# Altium footprint library PcbLib_jp.PcbLib: 178 footprints (part 7 of 12)
Each footprint in its own frame and in the unit in brackets; x right, y up, seen from the top. Pads: shape width x height; smd on the part's side, far side on the other; paste and mask are expansions set on the pad; w line width, h text height; cw(c..) or ccw(c..) is an arc to the next point about the centre after c.
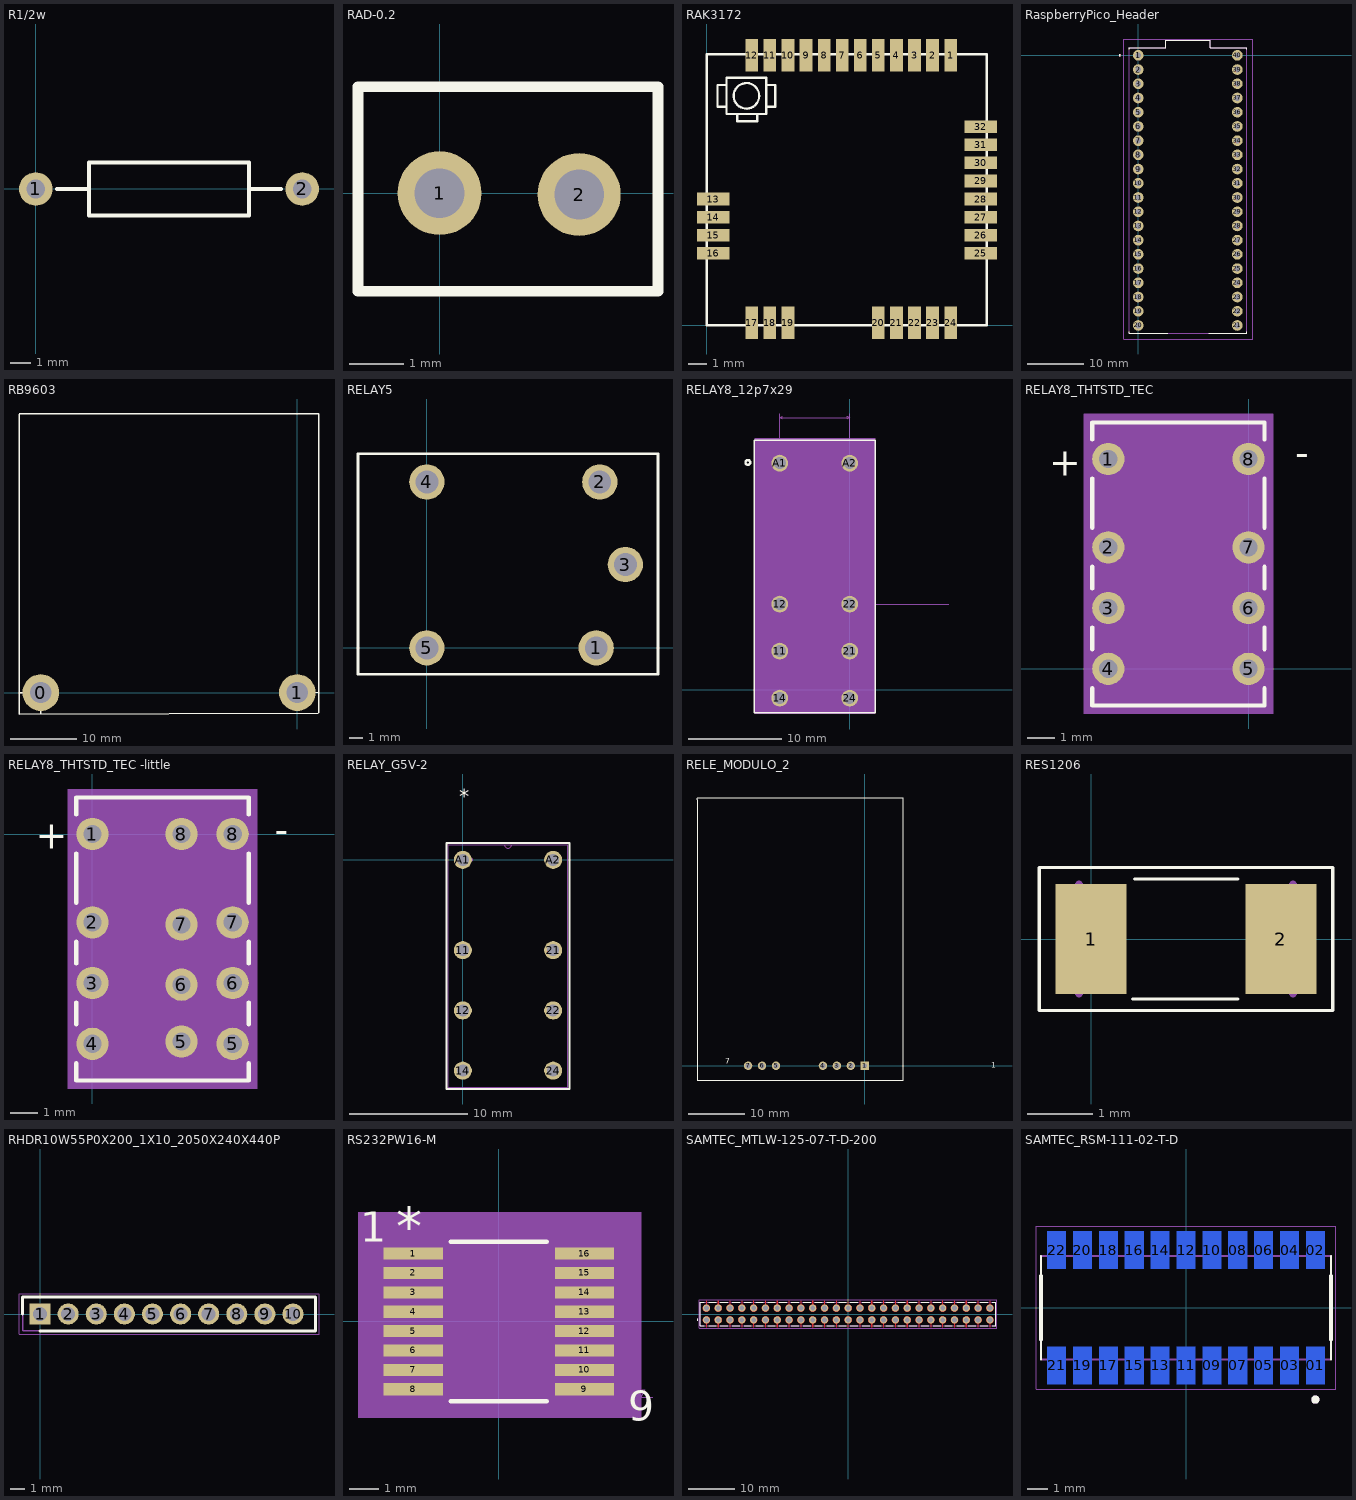
[diagram p6: the footprints below, top view; thin cyan lines are the x and y axes]

## R1/2w [mm] "Axial Device, Thru-Hole; 2 Leads; 0.5 in Pin Spacing"
height 2.54
pads (2):
  round 1.6 hole 0.9: 1(0,0) 2(12.7,0)
Top Overlay:
  lines w0.2: 1.016,0 2.54,0 ; 10.16,0 11.684,0 ; 2.54,-1.27 2.54,1.27 10.16,1.27 10.16,-1.27 2.54,-1.27
3D body "70398111.stp": height 2.1, standoff -0.1, extent 3.526,-1.108 9.326,1.092

## RAD-0.2 [mil] "Radial Cap, Thru-Hole; 2 Leads; 0.2 in Pin Spacing"
pads (2):
  round 60.63 hole 35.98: 1(0,0)
  round 60 hole 35.98: 2(101,-1)
Top Overlay:
  lines w7.87: 158,76 158,-71 -59,-71 -59,77 158,77
3D body "User Library-Jumper SL2.STEP": height 452.76, standoff -23.62, extent -53.42,-51 143.43,49

## RAK3172 [mm]
pads (32):
  rect 0.7x1.8 smd: 1(13.5,14.945) 2(12.5,14.945) 3(11.5,14.945) 4(10.5,14.945) 5(9.5,14.945) 6(8.5,14.945) 7(7.5,14.945) 8(6.5,14.945) 9(5.5,14.945) 10(4.5,14.945) 11(3.5,14.945) 12(2.5,14.945) 17(2.5,0.145) 18(3.5,0.145) 19(4.5,0.145) 20(9.5,0.145) 21(10.5,0.145) 22(11.5,0.145) 23(12.5,0.145) 24(13.5,0.145)
  rect 1.8x0.7 smd: 13(0.365,6.99) 14(0.365,5.99) 15(0.365,4.99) 16(0.365,3.99) 25(15.165,3.99) 26(15.165,4.99) 27(15.165,5.99) 28(15.165,6.99) 29(15.165,7.99) 30(15.165,8.99) 31(15.165,9.99) 32(15.165,10.99)
Top Overlay:
  circle w0.127: c2.2,12.7 r0.707
  lines w0.127: 1.1,12.1 1.1,11.7 1.7,11.7 ; 1.1,12.1 1.1,13.3 ; 1.1,12.1 0.6,12.1 0.6,13.3 1.1,13.3 ; 1.1,13.3 1.1,13.7 3.3,13.7 3.3,13.3 ; 1.7,11.7 1.7,11.3 2.8,11.3 2.8,11.7 ; 1.7,11.7 2.8,11.7 ; 2.8,11.7 3.3,11.7 3.3,12.1 ; 3.3,12.1 3.8,12.1 3.8,13.3 3.3,13.3 ; 3.3,12.1 3.3,13.3 ; 0,0 0,15 15.5,15 15.5,0 0,0
3D body "step_temp.STEP": height 4.5, standoff 0.99, extent 0.08,0.07 15.58,15.07

## RaspberryPico_Header [mil]
pads (40):
  round 75 hole 40: 1(0,0) 2(0,-100) 3(0,-200) 4(0,-300) 5(0,-400) 6(0,-500) 7(0,-600) 8(0,-700) 9(0,-800) 10(0,-900) 11(0,-1000) 12(0,-1100) 13(0,-1200) 14(0,-1300) 15(0,-1400) 16(0,-1500) 17(0,-1600) 18(0,-1700) 19(0,-1800) 20(0,-1900) 21(697.72,-1900) 22(697.72,-1800) 23(697.72,-1700) 24(697.72,-1600) 25(697.72,-1500) 26(697.72,-1400) 27(697.72,-1300) 28(697.72,-1200) 29(697.72,-1100) 30(697.72,-1000) 31(697.72,-900) 32(697.72,-800) 33(697.72,-700) 34(697.72,-600) 35(697.72,-500) 36(697.72,-400) 37(697.72,-300) 38(697.72,-200) 39(697.72,-100) 40(697.72,0)
Top Layer:
  circle w7.87: c-129,0 r3.94
Top Overlay:
  circle w7.87: c-128.92,0 r3.94
  lines w5: -62.39,-1944.09 -62.39,-1953.94 206.91,-1953.94 ; -62.39,44.09 -62.39,53.94 193.52,53.94 193.52,105.12 508.48,105.12 508.48,53.94 764.39,53.94 764.39,44.09 ; 495.09,-1953.94 764.39,-1953.94 764.39,-1944.09
Mechanical 13:
  circle w7.87: c-128.92,0 r3.94
  lines w5: -62.39,-1953.94 -62.39,53.94 193.52,53.94 193.52,105.12 508.48,105.12 508.48,53.94 764.39,53.94 764.39,-1953.94 -62.39,-1953.94
Mechanical 15:
  lines w1.97: -103.33,-1995.28 805.33,-1995.28 805.33,114.96 -103.33,114.96 -103.33,-1995.28
3D body: height 110.24, standoff 0, extent 277.72,-805 277.72,-805
3D body "PICO_PinsDown.STEP": height 442.13, standoff -59.06, extent -64.05,-1954.53 762.72,104.53

## RB9603 [mil] "Modulo Satelital"
pads (2):
  round 217.48 hole 125.98: 0(-1520,2) 1(-1,2)
Top Overlay:
  lines w7.99: -1648,-125 -1648,1649.65 ; -1648,1652 126.02,1652 126.02,-119 ; -1645,-125 123.65,-122 ; -1645.02,1 -1523,1 ; -1522,-124.02 -1522,1 ; -0.02,0 124,3
3D body "RockBLOCK_9603 v2.step": height 585.72, standoff -83.43, extent -1656.15,-117.84 117.47,2041.6

## RELAY5 [mil]
pads (5):
  round 100 / inner round 60 / far side round 100 hole 65: 1(480,0) 2(490,470) 3(562.47,236) 4(0,470) 5(0,0)
Top Overlay:
  lines w8: -195,-75 -195,550 655,550 655,-75 -195,-75
3D body "20648.stp": height 622.05, standoff -129.92, extent -158.76,-70.02 620.76,552.02

## RELAY8_12p7x29 [mil]
pads (8):
  round 71 hole 51 mask+0: 11(-295.28,163.26) 12(-295.28,361.69) 14(-295.28,-35.17) 21(0,163.26) 22(0,361.69) 24(0,-35.17) A1(-295.28,956.96) A2(0,956.96)
Top Overlay:
  circle w10: c-430,960 r10
  lines w6: -402.64,-97.52 -402.64,1054.48 107.36,1054.48 107.36,-97.52 -402.64,-97.52
Mechanical 5:
  region: 107.09,-102.36 -400.79,-102.36 -400.79,1061.02 107.09,1061.02
Mechanical 7:
  lines w1: -295.28,478.48 -295.28,1164.48 ; 0,478.48 0,1164.48 ; 102.36,361.69 417.36,361.69 ; -295.28,1149.48 -285.28,1144.48 -285.28,1154.48 -295.28,1149.48 ; -295.28,1149.48 0,1149.48 ; 0,1149.48 -10,1144.48 -10,1154.48 0,1149.48
Mechanical 13:
  circle w0: c-360,960 r3
  lines w0: -159.64,1049.48 ccw(c-147.64,1049.48) -135.64,1049.48
  lines w1: -397.64,-92.52 -397.64,1049.48 102.36,1049.48 102.36,-92.52 -397.64,-92.52
Mechanical 15:
  region: 102.36,-92.52 -397.64,-92.52 -397.64,1049.48 102.36,1049.48
  region: 104.36,-94.52 -399.64,-94.52 -399.64,1051.48 104.36,1051.48
  lines w6: -399.64,-94.52 104.36,-94.52 104.36,1051.48 -399.64,1051.48 -399.64,-94.52
3D body: height 10, standoff 0, extent 0,0 10,10
3D body "20557.stp": height 618.11, standoff -137.8, extent -397.99,-101.87 102.01,1039.87

## RELAY8_THTSTD_TEC [mil]
pads (8):
  round 46 hole 26 mask+0: 1(-200,299.51) 2(-200,173.51) 3(-200,86.9) 4(-200,0.28) 5(0,0.28) 6(0,86.9) 7(0,173.51) 8(0,299.51)
Top Overlay:
  lines w6: -223,-27.54 -223,-52.24 23,-52.24 23,-27.54 ; -223,28.11 -223,59.07 ; -223,114.72 -223,145.69 ; -223,201.34 -223,271.69 ; -223,327.34 -223,351.76 23,351.76 23,327.34 ; 23,28.11 23,59.07 ; 23,114.72 23,145.69 ; 23,201.34 23,271.69
  text "-" at 66.54,289.1 h39.37
  text "+" at -284.25,275.98 h39.37
Mechanical 5:
  region: 35,-64.24 -235,-64.24 -235,363.76 35,363.76
Mechanical 13:
  circle w0: c-160,300 r3
  lines w0: -112,346.76 ccw(c-100,346.76) -88,346.76
  lines w1: -218,-47.24 -218,346.76 18,346.76 18,-47.24 -218,-47.24
Mechanical 15:
  region: 18,-47.24 -218,-47.24 -218,346.76 18,346.76
  region: 28,-58 -228,-58 -228,357 28,357
  lines w6: -228,-58 28,-58 28,357 -228,357 -228,-58
3D body: height 10, standoff 0, extent 0,0 10,10
3D body "6-1462037-6.stp": height 183.07, standoff -165.35, extent -217.1,-48.85 19.11,344.85

## RELAY8_THTSTD_TEC -little [mil]
pads (12):
  round 46 hole 26 mask+0: 1(0,0) 2(0,-126) 3(0,-212.61) 4(0,-299.23) 5(200,-299.23) 6(200,-212.61) 7(200,-126) 8(200,0)
  round 46 hole 26: 5(127,-296) 6(127,-215) 7(127,-129) 8(127,0)
Top Overlay:
  lines w6: -23,-327.05 -23,-351.76 223,-351.76 223,-327.05 ; -23,-271.4 -23,-240.44 ; -23,-184.79 -23,-153.82 ; -23,-98.18 -23,-27.82 ; -23,27.82 -23,52.24 223,52.24 223,27.82 ; 223,-271.4 223,-240.44 ; 223,-184.79 223,-153.82 ; 223,-98.18 223,-27.82
  text "-" at 260,-13 h39.37
  text "+" at -81,-21 h39.37
Mechanical 5:
  region: 235,-363.76 -35,-363.76 -35,64.24 235,64.24
Mechanical 13:
  circle w0: c40,0.49 r3
  lines w0: 88,47.24 ccw(c100,47.24) 112,47.24
  lines w1: -18,-346.76 218,-346.76 218,47.24 -18,47.24 -18,-346.76
Mechanical 15:
  region: 228,-357.51 -28,-357.51 -28,57.49 228,57.49
  region: 218,-346.76 -18,-346.76 -18,47.24 218,47.24
  lines w6: -28,-357.51 -28,57.49 228,57.49 228,-357.51 -28,-357.51
3D body "6-1462037-6.stp": height 183.07, standoff -165.35, extent -15.74,-345.67 220.48,48.03
3D body: height 10, standoff 0, extent 200,-296.46 210,-289.51

## RELAY_G5V-2 [mil]
pads (8):
  round 60 hole 40 mask+0: 11(0,-300) 12(0,-500) 14(0,-700) 21(300,-300) 22(300,-500) 24(300,-700) A1(0,0) A2(300,0)
Top Overlay:
  lines w6: -54,-761 354,-761 354,56 -54,56 -54,-761
  text "*" at -12.5,185.33 h50
Mechanical 13:
  circle w0: c30,0 r3
  lines w0: 138,51 ccw(c150,51) 162,51
  lines w1: -49,-756 349,-756 349,51 -49,51 -49,-756
3D body "91b4054_v23105a5001a201.stp": height 393.7, standoff -165.35, extent -49.85,-743.63 343.85,51.65
3D body: height 559.05, standoff 0, extent -6,12 -6,12
3D body: height 10, standoff 0, extent 0,0 10,10

## RELE_MODULO_2 [mm] "Connector; Header; 6 Position"
pads (7):
  rect 1.524x1.524 hole 0.762: 1(0,0)
  round 1.5 hole 0.9: 2(-2.508,-0.012) 3(-5.004,-0.012) 4(-7.5,-0.012) 5(-15.9,-0.012) 6(-18.4,-0.012) 7(-20.9,-0.012)
Top Overlay:
  lines w0.2: -30.04,47.906 -30.04,47.64 -30.04,-2.6 6.84,-2.6 6.84,47.946 -30.04,47.946
  text "7" at -24.994,0.315 h1
  text "1" at 22.656,-0.371 h1
3D body "User Library-RelayBoard.STEP": height 17.09, standoff -2.21, extent -30.04,-2.6 6.84,47.946

## RES1206 [mm]
pads (2):
  rect 1.08x1.68 smd: 1(0,0) 2(2.89,0)
Top Overlay:
  lines w0.05: 0.635,-0.914 2.235,-0.914 ; 0.66,0.914 2.235,0.914 ; -0.792,-1.09 -0.792,1.09 3.682,1.09 3.682,-1.09 -0.792,-1.09
Mechanical 13:
  lines w0.127: -0.185,-0.83 -0.185,0.83 -0.185,-0.83 ; 3.075,-0.83 3.075,0.83 3.075,-0.83
3D body "User Library-CR3216-1206.STEP": height 0.57, standoff -0.03, extent -0.178,-0.8 3.022,0.8

## RHDR10W55P0X200_1X10_2050X240X440P [mm]
pads (10):
  rect 1.5x1.5 hole 1: 1(0,0)
  round 1.5 hole 1: 2(2,0) 3(4,0) 4(6,0) 5(8,0) 6(10,0) 7(12,0) 8(14,0) 9(16,0) 10(18,0)
Top Overlay:
  lines w0.2: -1.25,0 -1.25,1.2 19.6,1.2 19.6,-1.2 0,-1.2
Mechanical 13:
  lines w0.1: -1.25,-1.2 -1.25,1.2 19.6,1.2 19.6,-1.2 -1.25,-1.2
Mechanical 15:
  lines w0.05: -1.5,-1.45 -1.5,1.45 19.85,1.45 19.85,-1.45 -1.5,-1.45
3D body "NPPN101BFCN-RC.stp": height 4.4, standoff -2.6, extent -1.25,-1.2 19.25,1.2

## RS232PW16-M [mil]
pads (16):
  rect 78x16 smd paste+0 mask+0: 1(-113,89.57) 2(-113,63.98) 3(-113,38.39) 4(-113,12.8) 5(-113,-12.8) 6(-113,-38.39) 7(-113,-63.98) 8(-113,-89.57) 9(113,-89.57) 10(113,-63.98) 11(113,-38.39) 12(113,-12.8) 13(113,12.8) 14(113,38.39) 15(113,63.98) 16(113,89.57)
Top Overlay:
  lines w6: -63.58,-105.5 63.58,-105.5 ; -63.58,105.5 63.58,105.5
  text "9" at 171,-131 h39.37
  text "1" at -183,105 h39.37
  text "*" at -135.5,100.57 h50
Mechanical 5:
  region: 188,-127 -186,-127 -186,144 188,144
Mechanical 7:
  lines w1: 0,-100.5 203.5,-100.5 ; 183.5,-90.5 193.5,-90.5 188.5,-100.5 183.5,-90.5
Mechanical 13:
  lines w0: -12,100.5 ccw(c0,100.5) 12,100.5
  lines w1: -130,-95.57 -88.5,-95.57 -88.5,-83.57 -130,-83.57 -130,-95.57 ; -130,-69.98 -88.5,-69.98 -88.5,-57.98 -130,-57.98 -130,-69.98 ; -130,-44.39 -88.5,-44.39 -88.5,-32.39 -130,-32.39 -130,-44.39 ; -130,-18.8 -88.5,-18.8 -88.5,-6.8 -130,-6.8 -130,-18.8 ; -130,6.8 -88.5,6.8 -88.5,18.8 -130,18.8 -130,6.8 ; -130,32.39 -88.5,32.39 -88.5,44.39 -130,44.39 -130,32.39 ; -130,57.98 -88.5,57.98 -88.5,69.98 -130,69.98 -130,57.98 ; -130,83.57 -88.5,83.57 -88.5,95.57 -130,95.57 -130,83.57 ; -88.5,-100.5 -88.5,100.5 88.5,100.5 88.5,-100.5 -88.5,-100.5 ; 88.5,-95.57 130,-95.57 130,-83.57 88.5,-83.57 88.5,-95.57 ; 88.5,-69.98 130,-69.98 130,-57.98 88.5,-57.98 88.5,-69.98 ; 88.5,-44.39 130,-44.39 130,-32.39 88.5,-32.39 88.5,-44.39 ; 88.5,-18.8 130,-18.8 130,-6.8 88.5,-6.8 88.5,-18.8 ; 88.5,6.8 130,6.8 130,18.8 88.5,18.8 88.5,6.8 ; 88.5,32.39 130,32.39 130,44.39 88.5,44.39 88.5,32.39 ; 88.5,57.98 130,57.98 130,69.98 88.5,69.98 88.5,57.98 ; 88.5,83.57 130,83.57 130,95.57 88.5,95.57 88.5,83.57
  text "*" at -86,47.5 h50
3D body "User Library-AS3933-BTST.STEP": height 41.73, standoff -0.2, extent -127.95,-101.39 127.96,99.4
3D body: height 10, standoff 0, extent 0,0 10,10

## SAMTEC_MTLW-125-07-T-D-200 [mm]
pads (50):
  round 1.52 hole 1.02: 01(-30.48,-1.27) 02(-30.48,1.27) 03(-27.94,-1.27) 04(-27.94,1.27) 05(-25.4,-1.27) 06(-25.4,1.27) 07(-22.86,-1.27) 08(-22.86,1.27) 09(-20.32,-1.27) 10(-20.32,1.27) 11(-17.78,-1.27) 12(-17.78,1.27) 13(-15.24,-1.27) 14(-15.24,1.27) 15(-12.7,-1.27) 16(-12.7,1.27) 17(-10.16,-1.27) 18(-10.16,1.27) 19(-7.62,-1.27) 20(-7.62,1.27) 21(-5.08,-1.27) 22(-5.08,1.27) 23(-2.54,-1.27) 24(-2.54,1.27) 25(0,-1.27) 26(0,1.27) 27(2.54,-1.27) 28(2.54,1.27) 29(5.08,-1.27) 30(5.08,1.27) 31(7.62,-1.27) 32(7.62,1.27) 33(10.16,-1.27) 34(10.16,1.27) 35(12.7,-1.27) 36(12.7,1.27) 37(15.24,-1.27) 38(15.24,1.27) 39(17.78,-1.27) 40(17.78,1.27) 41(20.32,-1.27) 42(20.32,1.27) 43(22.86,-1.27) 44(22.86,1.27) 45(25.4,-1.27) 46(25.4,1.27) 47(27.94,-1.27) 48(27.94,1.27) 49(30.48,-1.27) 50(30.48,1.27)
Top Layer:
  drawing of 50 lines, arcs and shapes, not listed
Top Overlay:
  circle w0.2: c-32.4,-1.27 r0.1
  lines w0.2: -30.945,-2.515 -31.75,-2.515 -31.75,2.515 -30.945,2.515 ; -30.015,-2.515 -28.405,-2.515 ; -30.015,2.515 -28.405,2.515 ; -27.475,-2.515 -25.865,-2.515 ; -27.475,2.515 -25.865,2.515 ; -24.935,-2.515 -23.325,-2.515 ; -24.935,2.515 -23.325,2.515 ; -22.395,-2.515 -20.785,-2.515 ; -22.395,2.515 -20.785,2.515 ; -19.855,-2.515 -18.245,-2.515 ; -19.855,2.515 -18.245,2.515 ; -17.315,-2.515 -15.705,-2.515 ; -17.315,2.515 -15.705,2.515 ; -14.775,-2.515 -13.165,-2.515 ; -14.775,2.515 -13.165,2.515 ; -12.235,-2.515 -10.625,-2.515 ; -12.235,2.515 -10.625,2.515 ; -9.695,-2.515 -8.085,-2.515 ; -9.695,2.515 -8.085,2.515 ; -7.155,-2.515 -5.545,-2.515 ; -7.155,2.515 -5.545,2.515 ; -4.615,-2.515 -3.005,-2.515 ; -4.615,2.515 -3.005,2.515 ; -2.075,-2.515 -0.465,-2.515 ; -2.075,2.515 -0.465,2.515 ; 0.465,-2.515 2.075,-2.515 ; 0.465,2.515 2.075,2.515 ; 3.005,-2.515 4.615,-2.515 ; 3.005,2.515 4.615,2.515 ; 5.545,-2.515 7.155,-2.515 ; 5.545,2.515 7.155,2.515 ; 8.085,-2.515 9.695,-2.515 ; 8.085,2.515 9.695,2.515 ; 10.625,-2.515 12.235,-2.515 ; 10.625,2.515 12.235,2.515 ; 13.165,-2.515 14.775,-2.515 ; 13.165,2.515 14.775,2.515 ; 15.705,-2.515 17.315,-2.515 ; 15.705,2.515 17.315,2.515 ; 18.245,-2.515 19.855,-2.515 ; 18.245,2.515 19.855,2.515 ; 20.785,-2.515 22.395,-2.515 ; 20.785,2.515 22.395,2.515 ; 23.325,-2.515 24.935,-2.515 ; 23.325,2.515 24.935,2.515 ; 25.865,-2.515 27.475,-2.515 ; 25.865,2.515 27.475,2.515 ; 28.405,-2.515 30.015,-2.515 ; 28.405,2.515 30.015,2.515 ; 30.945,-2.515 31.75,-2.515 31.75,2.515 30.945,2.515
Top Paste:
  drawing of 50 lines, arcs and shapes, not listed
Top Solder:
  drawing of 50 lines, arcs and shapes, not listed
Mechanical 13:
  circle w0.2: c-32.4,-1.27 r0.1
  lines w0.1: -31.75,-2.515 -31.75,2.515 31.75,2.515 31.75,-2.515 -31.75,-2.515
Mechanical 15:
  lines w0.05: -32,-3.05 -32,3.05 32,3.05 32,-3.05 -32,-3.05
3D body "52k4541_7-534206-5.stp": height 8, standoff -3.56, extent -31.685,-2.415 31.815,2.614

## SAMTEC_RSM-111-02-T-D [mm]
pads (22):
  rect 0.91x1.84 smd far side: 01(6.35,-2.825) 02(6.35,2.825) 03(5.08,-2.825) 04(5.08,2.825) 05(3.81,-2.825) 06(3.81,2.825) 07(2.54,-2.825) 08(2.54,2.825) 09(1.27,-2.825) 10(1.27,2.825) 11(0,-2.825) 12(0,2.825) 13(-1.27,-2.825) 14(-1.27,2.825) 15(-2.54,-2.825) 16(-2.54,2.825) 17(-3.81,-2.825) 18(-3.81,2.825) 19(-5.08,-2.825) 20(-5.08,2.825) 21(-6.35,-2.825) 22(-6.35,2.825)
Top Overlay:
  circle w0.2: c6.35,-4.505 r0.1
  lines w0.1: -7.11,-2.54 -7.11,2.54 ; 7.11,-2.54 7.11,2.54
  lines w0.2: -7.11,-1.555 -7.11,1.555 ; 7.11,-1.555 7.11,1.555
Mechanical 13:
  circle w0.2: c6.35,-4.505 r0.1
  lines w0.1: -7.11,-2.54 7.11,-2.54 ; -7.11,2.54 7.11,2.54
Mechanical 15:
  lines w0.05: -7.36,-3.995 -7.36,3.995 7.36,3.995 7.36,-3.995 -7.36,-3.995